# Altium schematic symbol library Capacitor - Aluminium TH.SchLib: 4591 symbols (part 14 of 27)
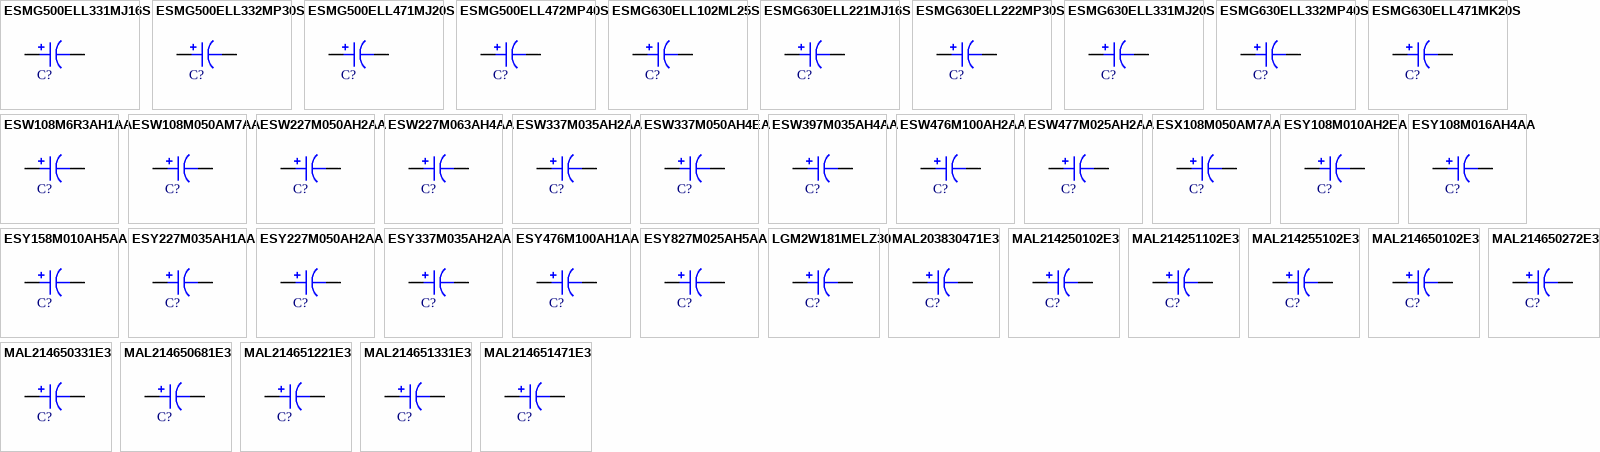
[diagram p127: symbols ESMG500ELL331MJ16S to MAL214651471E3]

## ESMG630ELL221MJ16S
designator C?, comment 220uF  (value not drawn)
CAP ALUM 220UF 20% 63V RADIAL; Part Number: ESMG630ELL221MJ16S; Manufacturer: United Chemi-Con; TemperatureRange: -40C ~ 85C; Type: Polar; Ripple Current: 490mA @ 120Hz; Value: 220uF; PartId: 25335; Supplier 1: Digi-Key; Supplier Part Number 1: 565-1129-ND; ComponentLink1Description: Datasheet; ComponentLink1URL: http://www.chemi-con.com/upload/files/6/3/873997624d9b1bc8060f8.pdf; ComponentLink2Description: Digi-Key Listing; ComponentLink2URL: https://www.digikey.com/product-detail/en/united-chemi-con/ESMG630ELL221MJ16S/565-1129-ND/755645; Tolerance: 20%; Voltage: 63V; Price: 0.67; Device Package: Radial, Can, 10mm
footprint CAP AL TH D10 L5 H17.5
pins: 1, 2

## ESMG630ELL222MP30S
designator C?, comment 2200uF  (value not drawn)
CAP ALUM 2200UF 20% 63V RADIAL; Part Number: ESMG630ELL222MP30S; Manufacturer: United Chemi-Con; TemperatureRange: -40C ~ 85C; Type: Polar; Ripple Current: 2.19A @ 120Hz; Value: 2200uF; PartId: 27563; Supplier 1: Digi-Key; Supplier Part Number 1: 565-1137-ND; ComponentLink1Description: Datasheet; ComponentLink1URL: http://www.chemi-con.com/upload/files/6/3/873997624d9b1bc8060f8.pdf; ComponentLink2Description: Digi-Key Listing; ComponentLink2URL: https://www.digikey.com/product-detail/en/united-chemi-con/ESMG630ELL222MP30S/565-1137-ND/755653; Tolerance: 20%; Voltage: 63V; Price: 4.28; Device Package: Radial, Can, 22mm
footprint CAP AL TH D22 L10 H33
pins: 1, 2

## ESMG630ELL331MJ20S
designator C?, comment 330uF  (value not drawn)
CAP ALUM 330UF 20% 63V RADIAL; Part Number: ESMG630ELL331MJ20S; Manufacturer: United Chemi-Con; TemperatureRange: -40C ~ 85C; Type: Polar; Ripple Current: 710mA @ 120Hz; Value: 330uF; PartId: 25671; Supplier 1: Digi-Key; Supplier Part Number 1: 565-1130-ND; ComponentLink1Description: Datasheet; ComponentLink1URL: http://www.chemi-con.com/upload/files/6/3/873997624d9b1bc8060f8.pdf; ComponentLink2Description: Digi-Key Listing; ComponentLink2URL: https://www.digikey.com/product-detail/en/united-chemi-con/ESMG630ELL331MJ20S/565-1130-ND/755646; Tolerance: 20%; Voltage: 63V; Price: 0.77; Device Package: Radial, Can, 10mm
footprint CAP AL TH D10 L5 H22
pins: 1, 2

## ESMG630ELL332MP40S
designator C?, comment 3300uF  (value not drawn)
CAP ALUM 3300UF 20% 63V RADIAL; Part Number: ESMG630ELL332MP40S; Manufacturer: United Chemi-Con; TemperatureRange: -40C ~ 85C; Type: Polar; Ripple Current: 2.81A @ 120Hz; Value: 3300uF; PartId: 27583; Supplier 1: Digi-Key; Supplier Part Number 1: 565-1138-ND; ComponentLink1Description: Datasheet; ComponentLink1URL: http://www.chemi-con.com/upload/files/6/3/873997624d9b1bc8060f8.pdf; ComponentLink2Description: Digi-Key Listing; ComponentLink2URL: https://www.digikey.com/product-detail/en/united-chemi-con/ESMG630ELL332MP40S/565-1138-ND/755654; Tolerance: 20%; Voltage: 63V; Price: 5.18; Device Package: Radial, Can, 22mm
footprint CAP AL TH D22 L10 H43
pins: 1, 2

## ESMG630ELL471MK20S
designator C?, comment 470uF  (value not drawn)
CAP ALUM 470UF 20% 63V RADIAL; Part Number: ESMG630ELL471MK20S; Manufacturer: United Chemi-Con; TemperatureRange: -40C ~ 85C; Type: Polar; Ripple Current: 900mA @ 120Hz; Value: 470uF; PartId: 23023; Supplier 1: Digi-Key; Supplier Part Number 1: 565-1131-ND; ComponentLink1Description: Datasheet; ComponentLink1URL: http://www.chemi-con.com/upload/files/6/3/873997624d9b1bc8060f8.pdf; ComponentLink2Description: Digi-Key Listing; ComponentLink2URL: https://www.digikey.com/product-detail/en/united-chemi-con/ESMG630ELL471MK20S/565-1131-ND/755647; Tolerance: 20%; Voltage: 63V; Price: 0; Device Package: Radial, Can, 12.5mm
footprint CAP AL TH D12.5 L5 H21.5
pins: 1, 2

## ESW108M6R3AH1AA
designator C?, comment 1000uF  (value not drawn)
CAP ALUM 1000UF 20% 6.3V RADIAL; Part Number: ESW108M6R3AH1AA; Manufacturer: KEMET; TemperatureRange: -40C ~ 105C; Type: Polar; Ripple Current: 453mA @ 120Hz; Impedance: 90 mOhm; Value: 1000uF; PartId: 24830; Supplier 1: Digi-Key; Supplier Part Number 1: 399-6625-ND; ComponentLink1Description: Datasheet; ComponentLink1URL: http://www.kemet.com/docfinder?Partnumber=ESW108M6R3AH1AA; ComponentLink2Description: Digi-Key Listing; ComponentLink2URL: https://www.digikey.com/product-detail/en/kemet/ESW108M6R3AH1AA/399-6625-ND/3083040; Tolerance: 20%; Voltage: 6.3V; Price: 0.46; Device Package: Radial, Can, 10mm
footprint CAP AL TH D10 L5 H14.5
pins: 1, 2

## ESW108M050AM7AA
designator C?, comment 1000uF  (value not drawn)
CAP ALUM 1000UF 20% 50V RADIAL; Part Number: ESW108M050AM7AA; Manufacturer: KEMET; TemperatureRange: -40C ~ 105C; Type: Polar; Ripple Current: 1.341A @ 120Hz; Impedance: 34 mOhm; Value: 1000uF; PartId: 26921; Supplier 1: Digi-Key; Supplier Part Number 1: 399-6623-ND; ComponentLink1Description: Datasheet; ComponentLink1URL: http://www.kemet.com/docfinder?Partnumber=ESW108M050AM7AA; ComponentLink2Description: Digi-Key Listing; ComponentLink2URL: https://www.digikey.com/product-detail/en/kemet/ESW108M050AM7AA/399-6623-ND/3083038; Tolerance: 20%; Voltage: 50V; Price: 1.7; Device Package: Radial, Can, 16mm
footprint CAP AL TH D16 L7.5 H27
pins: 1, 2

## ESW227M050AH2AA
designator C?, comment 220uF  (value not drawn)
CAP ALUM 220UF 20% 50V RADIAL; Part Number: ESW227M050AH2AA; Manufacturer: KEMET; TemperatureRange: -40C ~ 105C; Type: Polar; Ripple Current: 425mA @ 120Hz; Impedance: 119 mOhm; Value: 220uF; PartId: 25265; Supplier 1: Digi-Key; Supplier Part Number 1: 399-6628-ND; ComponentLink1Description: Datasheet; ComponentLink1URL: http://www.kemet.com/docfinder?Partnumber=ESW227M050AH2AA; ComponentLink2Description: Digi-Key Listing; ComponentLink2URL: https://www.digikey.com/product-detail/en/kemet/ESW227M050AH2AA/399-6628-ND/3083043; Tolerance: 20%; Voltage: 50V; Price: 0.6; Device Package: Radial, Can, 10mm
footprint CAP AL TH D10 L5 H17.5
pins: 1, 2

## ESW227M063AH4AA
designator C?, comment 220uF  (value not drawn)
CAP ALUM 220UF 20% 63V RADIAL; Part Number: ESW227M063AH4AA; Manufacturer: KEMET; TemperatureRange: -40C ~ 105C; Type: Polar; Ripple Current: 442.5mA @ 120Hz; Impedance: 147 mOhm; Value: 220uF; PartId: 25641; Supplier 1: Digi-Key; Supplier Part Number 1: 399-6114-ND; ComponentLink1Description: Datasheet; ComponentLink1URL: http://www.kemet.com/docfinder?Partnumber=ESW227M063AH4AA; ComponentLink2Description: Digi-Key Listing; ComponentLink2URL: https://www.digikey.com/product-detail/en/kemet/ESW227M063AH4AA/399-6114-ND/2712543; Tolerance: 20%; Voltage: 63V; Price: 0.73; Device Package: Radial, Can, 10mm
footprint CAP AL TH D10 L5 H22
pins: 1, 2

## ESW337M035AH2AA
designator C?, comment 330uF  (value not drawn)
CAP ALUM 330UF 20% 35V RADIAL; Part Number: ESW337M035AH2AA; Manufacturer: KEMET; TemperatureRange: -40C ~ 105C; Type: Polar; Ripple Current: 577.5mA @ 120Hz; Impedance: 68 mOhm; Value: 330uF; PartId: 25216; Supplier 1: Digi-Key; Supplier Part Number 1: 399-6115-ND; ComponentLink1Description: Datasheet; ComponentLink1URL: http://www.kemet.com/docfinder?Partnumber=ESW337M035AH2AA; ComponentLink2Description: Digi-Key Listing; ComponentLink2URL: https://www.digikey.com/product-detail/en/kemet/ESW337M035AH2AA/399-6115-ND/2712545; Tolerance: 20%; Voltage: 35V; Price: 0.53; Device Package: Radial, Can, 10mm
footprint CAP AL TH D10 L5 H17.5
pins: 1, 2

## ESW337M050AH4EA
designator C?, comment 330uF  (value not drawn)
CAP ALUM 330UF 20% 50V RADIAL; Part Number: ESW337M050AH4EA; Manufacturer: KEMET; TemperatureRange: -40C ~ 105C; Type: Polar; Ripple Current: 566.5mA @ 120Hz; Impedance: 90 mOhm; Value: 330uF; PartId: 25472; Supplier 1: Digi-Key; Supplier Part Number 1: 399-6661-3-ND; ComponentLink1Description: Datasheet; ComponentLink1URL: http://www.kemet.com/docfinder?Partnumber=ESW337M050AH4EA; ComponentLink2Description: Digi-Key Listing; ComponentLink2URL: https://www.digikey.com/product-detail/en/kemet/ESW337M050AH4EA/399-6661-3-ND/3083076; Tolerance: 20%; Voltage: 50V; Price: 0.2933; Device Package: Radial, Can, 10mm
footprint CAP AL TH D10 L5 H22
pins: 1, 2

## ESW397M035AH4AA
designator C?, comment 390uF  (value not drawn)
CAP ALUM 390UF 20% 35V RADIAL; Part Number: ESW397M035AH4AA; Manufacturer: KEMET; TemperatureRange: -40C ~ 105C; Type: Polar; Ripple Current: 671mA @ 120Hz; Impedance: 52 mOhm; Value: 390uF; PartId: 25512; Supplier 1: Digi-Key; Supplier Part Number 1: 399-6630-ND; ComponentLink1Description: Datasheet; ComponentLink1URL: http://www.kemet.com/docfinder?Partnumber=ESW397M035AH4AA; ComponentLink2Description: Digi-Key Listing; ComponentLink2URL: https://www.digikey.com/product-detail/en/kemet/ESW397M035AH4AA/399-6630-ND/3083045; Tolerance: 20%; Voltage: 35V; Price: 0.54; Device Package: Radial, Can, 10mm
footprint CAP AL TH D10 L5 H22
pins: 1, 2

## ESW476M100AH2AA
designator C?, comment 47uF  (value not drawn)
CAP ALUM 47UF 20% 100V RADIAL; Part Number: ESW476M100AH2AA; Manufacturer: KEMET; TemperatureRange: -40C ~ 105C; Type: Polar; Ripple Current: 210mA @ 120Hz; Impedance: 370 mOhm; Value: 47uF; PartId: 25145; Supplier 1: Digi-Key; Supplier Part Number 1: 399-6631-ND; ComponentLink1Description: Datasheet; ComponentLink1URL: http://www.kemet.com/docfinder?Partnumber=ESW476M100AH2AA; ComponentLink2Description: Digi-Key Listing; ComponentLink2URL: https://www.digikey.com/product-detail/en/kemet/ESW476M100AH2AA/399-6631-ND/3083046; Tolerance: 20%; Voltage: 100V; Price: 0.41; Device Package: Radial, Can, 10mm
footprint CAP AL TH D10 L5 H17.5
pins: 1, 2

## ESW477M025AH2AA
designator C?, comment 470uF  (value not drawn)
CAP ALUM 470UF 20% 25V RADIAL; Part Number: ESW477M025AH2AA; Manufacturer: KEMET; TemperatureRange: -40C ~ 105C; Type: Polar; Ripple Current: 577.5mA @ 120Hz; Impedance: 68 mOhm; Value: 470uF; PartId: 25280; Supplier 1: Digi-Key; Supplier Part Number 1: 399-6116-ND; ComponentLink1Description: Datasheet; ComponentLink1URL: http://www.kemet.com/docfinder?Partnumber=ESW477M025AH2AA; ComponentLink2Description: Digi-Key Listing; ComponentLink2URL: https://www.digikey.com/product-detail/en/kemet/ESW477M025AH2AA/399-6116-ND/2712546; Tolerance: 20%; Voltage: 25V; Price: 0.62; Device Package: Radial, Can, 10mm
footprint CAP AL TH D10 L5 H17.5
pins: 1, 2

## ESX108M050AM7AA
designator C?, comment 1000uF  (value not drawn)
CAP ALUM 1000UF 20% 50V RADIAL; Part Number: ESX108M050AM7AA; Manufacturer: KEMET; TemperatureRange: -40C ~ 105C; Type: Polar; Ripple Current: 1.44A @ 120Hz; Impedance: 60 mOhm; Value: 1000uF; PartId: 26859; Supplier 1: Digi-Key; Supplier Part Number 1: 399-6635-ND; ComponentLink1Description: Datasheet; ComponentLink1URL: //media.digikey.com/pdf/Data%20Sheets/Kemet%20PDFs/Aluminum_Capacitors.pdf; ComponentLink2Description: Digi-Key Listing; ComponentLink2URL: https://www.digikey.com/product-detail/en/kemet/ESX108M050AM7AA/399-6635-ND/3083050; Tolerance: 20%; Voltage: 50V; Price: 1.22; Device Package: Radial, Can, 16mm
footprint CAP AL TH D16 L7.5 H27
pins: 1, 2

## ESY108M010AH2EA
designator C?, comment 1000uF  (value not drawn)
CAP ALUM 1000UF 20% 10V RADIAL; Part Number: ESY108M010AH2EA; Manufacturer: KEMET; TemperatureRange: -40C ~ 105C; Type: Polar; Ripple Current: 1.072A @ 120Hz; Impedance: 38 mOhm; Value: 1000uF; PartId: 25017; Supplier 1: Digi-Key; Supplier Part Number 1: 399-6662-3-ND; ComponentLink1Description: Datasheet; ComponentLink1URL: http://www.kemet.com/docfinder?Partnumber=ESY108M010AH2EA; ComponentLink2Description: Digi-Key Listing; ComponentLink2URL: https://www.digikey.com/product-detail/en/kemet/ESY108M010AH2EA/399-6662-3-ND/3083077; Tolerance: 20%; Voltage: 10V; Price: 0.16; Device Package: Radial, Can, 10mm
footprint CAP AL TH D10 L5 H17.5
pins: 1, 2

## ESY108M016AH4AA
designator C?, comment 1000uF  (value not drawn)
CAP ALUM 1000UF 20% 16V RADIAL; Part Number: ESY108M016AH4AA; Manufacturer: KEMET; TemperatureRange: -40C ~ 105C; Type: Polar; Ripple Current: 1.365A @ 120Hz; Impedance: 26 mOhm; Value: 1000uF; PartId: 25630; Supplier 1: Digi-Key; Supplier Part Number 1: 399-6637-ND; ComponentLink1Description: Datasheet; ComponentLink1URL: http://www.kemet.com/docfinder?Partnumber=ESY108M016AH4AA; ComponentLink2Description: Digi-Key Listing; ComponentLink2URL: https://www.digikey.com/product-detail/en/kemet/ESY108M016AH4AA/399-6637-ND/3083052; Tolerance: 20%; Voltage: 16V; Price: 0.72; Device Package: Radial, Can, 10mm
footprint CAP AL TH D10 L5 H22
pins: 1, 2

## ESY158M010AH5AA
designator C?, comment 1500uF  (value not drawn)
CAP ALUM 1500UF 20% 10V RADIAL; Part Number: ESY158M010AH5AA; Manufacturer: KEMET; TemperatureRange: -40C ~ 105C; Type: Polar; Ripple Current: 1.72A @ 120Hz; Impedance: 23 mOhm; Value: 1500uF; PartId: 26086; Supplier 1: Digi-Key; Supplier Part Number 1: 399-6638-ND; ComponentLink1Description: Datasheet; ComponentLink1URL: http://www.kemet.com/docfinder?Partnumber=ESY158M010AH5AA; ComponentLink2Description: Digi-Key Listing; ComponentLink2URL: https://www.digikey.com/product-detail/en/kemet/ESY158M010AH5AA/399-6638-ND/3083053; Tolerance: 20%; Voltage: 10V; Price: 0.73; Device Package: Radial, Can, 10mm
footprint CAP AL TH D10 L5 H30
pins: 1, 2

## ESY227M035AH1AA
designator C?, comment 220uF  (value not drawn)
CAP ALUM 220UF 20% 35V RADIAL; Part Number: ESY227M035AH1AA; Manufacturer: KEMET; TemperatureRange: -40C ~ 105C; Type: Polar; Ripple Current: 721mA @ 120Hz; Impedance: 53 mOhm; Value: 220uF; PartId: 24837; Supplier 1: Digi-Key; Supplier Part Number 1: 399-6122-ND; ComponentLink1Description: Datasheet; ComponentLink1URL: http://capacitoredge.kemet.com/capedge2/DataSheet?pn=ESY227M035AH1AA; ComponentLink2Description: Digi-Key Listing; ComponentLink2URL: https://www.digikey.com/product-detail/en/kemet/ESY227M035AH1AA/399-6122-ND/2712528; Tolerance: 20%; Voltage: 35V; Price: 0.46; Device Package: Radial, Can, 10mm
footprint CAP AL TH D10 L5 H14.5
pins: 1, 2

## ESY227M050AH2AA
designator C?, comment 220uF  (value not drawn)
CAP ALUM 220UF 20% 50V RADIAL; Part Number: ESY227M050AH2AA; Manufacturer: KEMET; TemperatureRange: -40C ~ 105C; Type: Polar; Ripple Current: 959mA @ 120Hz; Impedance: 42 mOhm; Value: 220uF; PartId: 25206; Supplier 1: Digi-Key; Supplier Part Number 1: 399-6123-ND; ComponentLink1Description: Datasheet; ComponentLink1URL: http://capacitoredge.kemet.com/capedge2/DataSheet?pn=ESY227M050AH2AA; ComponentLink2Description: Digi-Key Listing; ComponentLink2URL: https://www.digikey.com/product-detail/en/kemet/ESY227M050AH2AA/399-6123-ND/2712529; Tolerance: 20%; Voltage: 50V; Price: 0.51; Device Package: Radial, Can, 10mm
footprint CAP AL TH D10 L5 H17.5
pins: 1, 2

## ESY337M035AH2AA
designator C?, comment 330uF  (value not drawn)
CAP ALUM 330UF 20% 35V RADIAL; Part Number: ESY337M035AH2AA; Manufacturer: KEMET; TemperatureRange: -40C ~ 105C; Type: Polar; Ripple Current: 1.001A @ 120Hz; Impedance: 38 mOhm; Value: 330uF; PartId: 25376; Supplier 1: Digi-Key; Supplier Part Number 1: 399-6126-ND; ComponentLink1Description: Datasheet; ComponentLink1URL: http://capacitoredge.kemet.com/capedge2/DataSheet?pn=ESY337M035AH2AA; ComponentLink2Description: Digi-Key Listing; ComponentLink2URL: https://www.digikey.com/product-detail/en/kemet/ESY337M035AH2AA/399-6126-ND/2712531; Tolerance: 20%; Voltage: 35V; Price: 0.73; Device Package: Radial, Can, 10mm
footprint CAP AL TH D10 L5 H17.5
pins: 1, 2

## ESY476M100AH1AA
designator C?, comment 47uF  (value not drawn)
CAP ALUM 47UF 20% 100V RADIAL; Part Number: ESY476M100AH1AA; Manufacturer: KEMET; TemperatureRange: -40C ~ 105C; Type: Polar; Ripple Current: 315mA @ 120Hz; Impedance: 240 mOhm; Value: 47uF; PartId: 24728; Supplier 1: Digi-Key; Supplier Part Number 1: 399-6643-ND; ComponentLink1Description: Datasheet; ComponentLink1URL: http://www.kemet.com/docfinder?Partnumber=ESY476M100AH1AA; ComponentLink2Description: Digi-Key Listing; ComponentLink2URL: https://www.digikey.com/product-detail/en/kemet/ESY476M100AH1AA/399-6643-ND/3083058; Tolerance: 20%; Voltage: 100V; Price: 0.41; Device Package: Radial, Can, 10mm
footprint CAP AL TH D10 L5 H14.5
pins: 1, 2

## ESY827M025AH5AA
designator C?, comment 820uF  (value not drawn)
CAP ALUM 820UF 20% 25V RADIAL; Part Number: ESY827M025AH5AA; Manufacturer: KEMET; TemperatureRange: -40C ~ 105C; Type: Polar; Ripple Current: 1.612A @ 120Hz; Impedance: 23 mOhm; Value: 820uF; PartId: 26169; Supplier 1: Digi-Key; Supplier Part Number 1: 399-6647-ND; ComponentLink1Description: Datasheet; ComponentLink1URL: http://www.kemet.com/docfinder?Partnumber=ESY827M025AH5AA; ComponentLink2Description: Digi-Key Listing; ComponentLink2URL: https://www.digikey.com/product-detail/en/kemet/ESY827M025AH5AA/399-6647-ND/3083062; Tolerance: 20%; Voltage: 25V; Price: 0.94; Device Package: Radial, Can, 10mm
footprint CAP AL TH D10 L5 H30
pins: 1, 2

## LGM2W181MELZ30
designator C?, comment 180uF  (value not drawn)
CAP ALUM 180UF 20% 450V SNAP; Part Number: LGM2W181MELZ30; Manufacturer: Nichicon; TemperatureRange: -25C ~ 105C; Type: Polar; Ripple Current: 470mA @ 120Hz; Value: 180uF; PartId: 27566; Supplier 1: Digi-Key; Supplier Part Number 1: 493-14670-ND; ComponentLink1Description: Datasheet; ComponentLink1URL: //media.digikey.com/pdf/Data%20Sheets/Nichicon%20PDFs/LGM_Series_450V.pdf; ComponentLink2Description: Digi-Key Listing; ComponentLink2URL: https://www.digikey.com/product-detail/en/nichicon/LGM2W181MELZ30/493-14670-ND/6049374; Tolerance: 20%; Voltage: 450V; Price: 5.25; Device Package: Radial, Can, 22mm
footprint CAP AL TH D22 L10 H33
pins: 1, 2

## MAL203830471E3
designator C?, comment 470uF  (value not drawn)
CAP ALUM 470UF 20% 35V RADIAL; Part Number: MAL203830471E3; Manufacturer: Vishay BC Components; TemperatureRange: -40C ~ 85C; Ripple Current: 740mA; Value: 470uF; PartId: 25456; Supplier 1: Digi-Key; Supplier Part Number 1: MAL203830471E3-ND; ComponentLink1Description: Datasheet; ComponentLink1URL: http://www.vishay.com/docs/28309/038rsu.pdf; ComponentLink2Description: Digi-Key Listing; ComponentLink2URL: https://www.digikey.com/product-detail/en/vishay-bc-components/MAL203830471E3/MAL203830471E3-ND/3675028; Tolerance: 20%; Voltage: 35V; Price: 0.222; Device Package: Radial, Can, 10mm
footprint CAP AL TH D10 L5 H22
pins: 1, 2

## MAL214250102E3
designator C?, comment 1000uF  (value not drawn)
CAP ALUM 1000UF 20% 35V RADIAL; Part Number: MAL214250102E3; Manufacturer: Vishay BC Components; TemperatureRange: -40C ~ 105C; Ripple Current: 810mA; Value: 1000uF; PartId: 23340; Supplier 1: Digi-Key; Supplier Part Number 1: 4602PHBK-ND; ComponentLink1Description: Datasheet; ComponentLink1URL: http://www.vishay.com/docs/28402/142rhs.pdf; ComponentLink2Description: Digi-Key Listing; ComponentLink2URL: https://www.digikey.com/product-detail/en/vishay-bc-components/MAL214250102E3/4602PHBK-ND/2690941; Tolerance: 20%; Voltage: 35V; Price: 0.84; Device Package: Radial, Can, 12.5mm
footprint CAP AL TH D12.5 L5 H22
pins: 1, 2

## MAL214251102E3
designator C?, comment 1000uF  (value not drawn)
CAP ALUM 1000UF 20% 50V RADIAL; Part Number: MAL214251102E3; Manufacturer: Vishay BC Components; TemperatureRange: -40C ~ 105C; Ripple Current: 950mA; Value: 1000uF; PartId: 24023; Supplier 1: Digi-Key; Supplier Part Number 1: 4603PHBK-ND; ComponentLink1Description: Datasheet; ComponentLink1URL: http://www.vishay.com/docs/28402/142rhs.pdf; ComponentLink2Description: Digi-Key Listing; ComponentLink2URL: https://www.digikey.com/product-detail/en/vishay-bc-components/MAL214251102E3/4603PHBK-ND/2690959; Tolerance: 20%; Voltage: 50V; Price: 1.08; Device Package: Radial, Can, 12.5mm
footprint CAP AL TH D12.5 L5 H27
pins: 1, 2

## MAL214255102E3
designator C?, comment 1000uF  (value not drawn)
CAP ALUM 1000UF 20% 16V RADIAL; Part Number: MAL214255102E3; Manufacturer: Vishay BC Components; TemperatureRange: -40C ~ 105C; Ripple Current: 560mA; Value: 1000uF; PartId: 25224; Supplier 1: Digi-Key; Supplier Part Number 1: 4607PHBK-ND; ComponentLink1Description: Datasheet; ComponentLink1URL: http://www.vishay.com/docs/28402/142rhs.pdf; ComponentLink2Description: Digi-Key Listing; ComponentLink2URL: https://www.digikey.com/product-detail/en/vishay-bc-components/MAL214255102E3/4607PHBK-ND/2690997; Tolerance: 20%; Voltage: 16V; Price: 0.54; Device Package: Radial, Can, 10mm
footprint CAP AL TH D10 L5 H17.5
pins: 1, 2

## MAL214650102E3
designator C?, comment 1000uF  (value not drawn)
CAP ALUM 1000UF 20% 35V RADIAL; Part Number: MAL214650102E3; Manufacturer: Vishay BC Components; TemperatureRange: -55C ~ 125C; Type: Polar; Ripple Current: 2A; Impedance: 33 mOhm; Value: 1000uF; PartId: 24194; Supplier 1: Digi-Key; Supplier Part Number 1: 4489PHBK-ND; ComponentLink1Description: Datasheet; ComponentLink1URL: http://www.vishay.com/docs/28401/146rti.pdf; ComponentLink2Description: Digi-Key Listing; ComponentLink2URL: https://www.digikey.com/product-detail/en/vishay-bc-components/MAL214650102E3/4489PHBK-ND/2410354; Tolerance: 20%; Voltage: 35V; Price: 2.41; Device Package: Radial, Can, 12.5mm
footprint CAP AL TH D12.5 L5 H27
pins: 1, 2

## MAL214650272E3
designator C?, comment 2700uF  (value not drawn)
CAP ALUM 2700UF 20% 35V RADIAL; Part Number: MAL214650272E3; Manufacturer: Vishay BC Components; TemperatureRange: -55C ~ 125C; Type: Polar; Ripple Current: 3.2A; Impedance: 18 mOhm; Value: 2700uF; PartId: 27447; Supplier 1: Digi-Key; Supplier Part Number 1: 4495PHBK-ND; ComponentLink1Description: Datasheet; ComponentLink1URL: http://www.vishay.com/docs/28401/146rti.pdf; ComponentLink2Description: Digi-Key Listing; ComponentLink2URL: https://www.digikey.com/product-detail/en/vishay-bc-components/MAL214650272E3/4495PHBK-ND/2410360; Tolerance: 20%; Voltage: 35V; Price: 4.03; Device Package: Radial, Can, 16mm
footprint CAP AL TH D16 L7.5 H37
pins: 1, 2

## MAL214650331E3
designator C?, comment 330uF  (value not drawn)
CAP ALUM 330UF 20% 35V RADIAL; Part Number: MAL214650331E3; Manufacturer: Vishay BC Components; TemperatureRange: -55C ~ 125C; Type: Polar; Ripple Current: 1.1A; Impedance: 75 mOhm; Value: 330uF; PartId: 25437; Supplier 1: Digi-Key; Supplier Part Number 1: 4486PHBK-ND; ComponentLink1Description: Datasheet; ComponentLink1URL: http://www.vishay.com/docs/28401/146rti.pdf; ComponentLink2Description: Digi-Key Listing; ComponentLink2URL: https://www.digikey.com/product-detail/en/vishay-bc-components/MAL214650331E3/4486PHBK-ND/2410351; Tolerance: 20%; Voltage: 35V; Price: 1.31; Device Package: Radial, Can, 10mm
footprint CAP AL TH D10 L5 H17.5
pins: 1, 2

## MAL214650681E3
designator C?, comment 680uF  (value not drawn)
CAP ALUM 680UF 20% 35V RADIAL; Part Number: MAL214650681E3; Manufacturer: Vishay BC Components; TemperatureRange: -55C ~ 125C; Type: Polar; Ripple Current: 1.6A; Impedance: 43 mOhm; Value: 680uF; PartId: 23534; Supplier 1: Digi-Key; Supplier Part Number 1: 4488PHBK-ND; ComponentLink1Description: Datasheet; ComponentLink1URL: http://www.vishay.com/docs/28401/146rti.pdf; ComponentLink2Description: Digi-Key Listing; ComponentLink2URL: https://www.digikey.com/product-detail/en/vishay-bc-components/MAL214650681E3/4488PHBK-ND/2410353; Tolerance: 20%; Voltage: 35V; Price: 1.98; Device Package: Radial, Can, 12.5mm
footprint CAP AL TH D12.5 L5 H22
pins: 1, 2

## MAL214651221E3
designator C?, comment 220uF  (value not drawn)
CAP ALUM 220UF 20% 50V RADIAL; Part Number: MAL214651221E3; Manufacturer: Vishay BC Components; TemperatureRange: -55C ~ 125C; Type: Polar; Ripple Current: 900mA; Impedance: 120 mOhm; Value: 220uF; PartId: 25435; Supplier 1: Digi-Key; Supplier Part Number 1: 4499PHBK-ND; ComponentLink1Description: Datasheet; ComponentLink1URL: http://www.vishay.com/docs/28401/146rti.pdf; ComponentLink2Description: Digi-Key Listing; ComponentLink2URL: https://www.digikey.com/product-detail/en/vishay-bc-components/MAL214651221E3/4499PHBK-ND/2410364; Tolerance: 20%; Voltage: 50V; Price: 1.31; Device Package: Radial, Can, 10mm
footprint CAP AL TH D10 L5 H17.5
pins: 1, 2

## MAL214651331E3
designator C?, comment 330uF  (value not drawn)
CAP ALUM 330UF 20% 50V RADIAL; Part Number: MAL214651331E3; Manufacturer: Vishay BC Components; TemperatureRange: -55C ~ 125C; Type: Polar; Ripple Current: 1A; Impedance: 90 mOhm; Value: 330uF; PartId: 25997; Supplier 1: Digi-Key; Supplier Part Number 1: 4500PHBK-ND; ComponentLink1Description: Datasheet; ComponentLink1URL: http://www.vishay.com/docs/28401/146rti.pdf; ComponentLink2Description: Digi-Key Listing; ComponentLink2URL: https://www.digikey.com/product-detail/en/vishay-bc-components/MAL214651331E3/4500PHBK-ND/2410365; Tolerance: 20%; Voltage: 50V; Price: 1.52; Device Package: Radial, Can, 10mm
footprint CAP AL TH D10 L5 H22
pins: 1, 2

## MAL214651471E3
designator C?, comment 470uF  (value not drawn)
CAP ALUM 470UF 20% 50V RADIAL; Part Number: MAL214651471E3; Manufacturer: Vishay BC Components; TemperatureRange: -55C ~ 125C; Type: Polar; Ripple Current: 1.25A; Impedance: 65 mOhm; Value: 470uF; PartId: 23533; Supplier 1: Digi-Key; Supplier Part Number 1: 4501PHBK-ND; ComponentLink1Description: Datasheet; ComponentLink1URL: http://www.vishay.com/docs/28401/146rti.pdf; ComponentLink2Description: Digi-Key Listing; ComponentLink2URL: https://www.digikey.com/product-detail/en/vishay-bc-components/MAL214651471E3/4501PHBK-ND/2410366; Tolerance: 20%; Voltage: 50V; Price: 1.98; Device Package: Radial, Can, 12.5mm
footprint CAP AL TH D12.5 L5 H22
pins: 1, 2

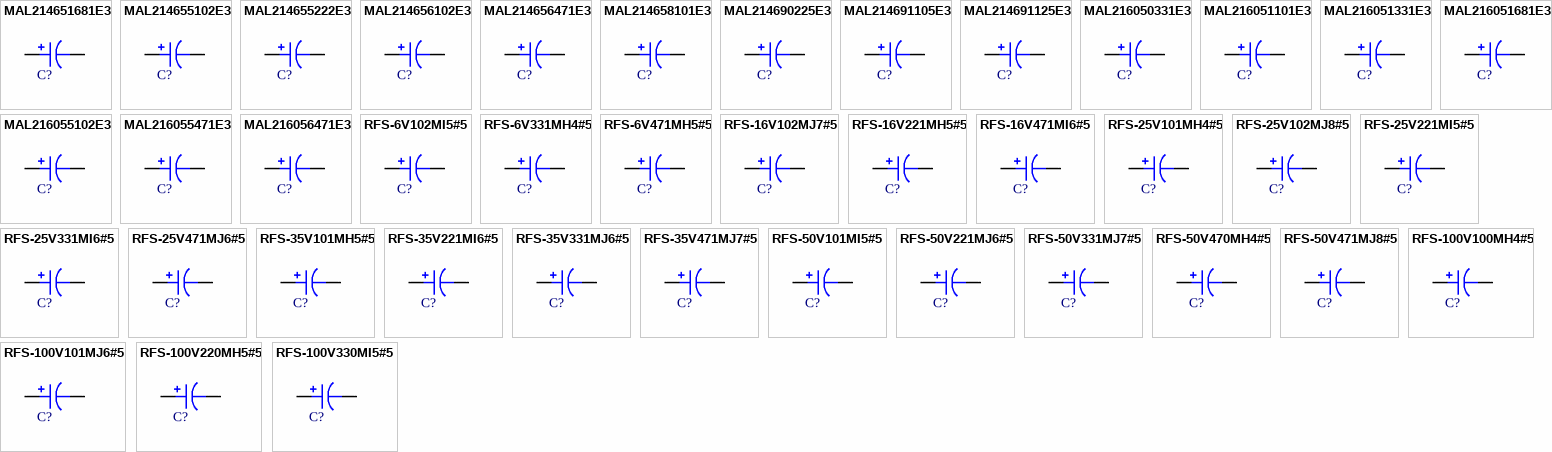
[diagram p56: symbols MAL214651681E3 to RFS-100V330MI5#5]

## MAL214651681E3
designator C?, comment 680uF  (value not drawn)
CAP ALUM 680UF 20% 50V RADIAL; Part Number: MAL214651681E3; Manufacturer: Vishay BC Components; TemperatureRange: -55C ~ 125C; Type: Polar; Ripple Current: 1.7A; Impedance: 50 mOhm; Value: 680uF; PartId: 24193; Supplier 1: Digi-Key; Supplier Part Number 1: 4502PHBK-ND; ComponentLink1Description: Datasheet; ComponentLink1URL: http://www.vishay.com/docs/28401/146rti.pdf; ComponentLink2Description: Digi-Key Listing; ComponentLink2URL: https://www.digikey.com/product-detail/en/vishay-bc-components/MAL214651681E3/4502PHBK-ND/2410367; Tolerance: 20%; Voltage: 50V; Price: 2.41; Device Package: Radial, Can, 12.5mm
footprint CAP AL TH D12.5 L5 H27
pins: 1, 2

## MAL214655102E3
designator C?, comment 1000uF  (value not drawn)
CAP ALUM 1000UF 20% 16V RADIAL; Part Number: MAL214655102E3; Manufacturer: Vishay BC Components; TemperatureRange: -55C ~ 125C; Type: Polar; Ripple Current: 1.25A; Impedance: 60 mOhm; Value: 1000uF; PartId: 25999; Supplier 1: Digi-Key; Supplier Part Number 1: 4462PHBK-ND; ComponentLink1Description: Datasheet; ComponentLink1URL: http://www.vishay.com/docs/28401/146rti.pdf; ComponentLink2Description: Digi-Key Listing; ComponentLink2URL: https://www.digikey.com/product-detail/en/vishay-bc-components/MAL214655102E3/4462PHBK-ND/2410327; Tolerance: 20%; Voltage: 16V; Price: 1.52; Device Package: Radial, Can, 10mm
footprint CAP AL TH D10 L5 H22
pins: 1, 2

## MAL214655222E3
designator C?, comment 2200uF  (value not drawn)
CAP ALUM 2200UF 20% 16V RADIAL; Part Number: MAL214655222E3; Manufacturer: Vishay BC Components; TemperatureRange: -55C ~ 125C; Type: Polar; Ripple Current: 2A; Impedance: 33 mOhm; Value: 2200uF; PartId: 24192; Supplier 1: Digi-Key; Supplier Part Number 1: 4464PHBK-ND; ComponentLink1Description: Datasheet; ComponentLink1URL: http://www.vishay.com/docs/28401/146rti.pdf; ComponentLink2Description: Digi-Key Listing; ComponentLink2URL: https://www.digikey.com/product-detail/en/vishay-bc-components/MAL214655222E3/4464PHBK-ND/2410329; Tolerance: 20%; Voltage: 16V; Price: 2.41; Device Package: Radial, Can, 12.5mm
footprint CAP AL TH D12.5 L5 H27
pins: 1, 2

## MAL214656102E3
designator C?, comment 1000uF  (value not drawn)
CAP ALUM 1000UF 20% 25V RADIAL; Part Number: MAL214656102E3; Manufacturer: Vishay BC Components; TemperatureRange: -55C ~ 125C; Type: Polar; Ripple Current: 1.6A; Impedance: 43 mOhm; Value: 1000uF; PartId: 23532; Supplier 1: Digi-Key; Supplier Part Number 1: 4475PHBK-ND; ComponentLink1Description: Datasheet; ComponentLink1URL: http://www.vishay.com/docs/28401/146rti.pdf; ComponentLink2Description: Digi-Key Listing; ComponentLink2URL: https://www.digikey.com/product-detail/en/vishay-bc-components/MAL214656102E3/4475PHBK-ND/2410340; Tolerance: 20%; Voltage: 25V; Price: 1.98; Device Package: Radial, Can, 12.5mm
footprint CAP AL TH D12.5 L5 H22
pins: 1, 2

## MAL214656471E3
designator C?, comment 470uF  (value not drawn)
CAP ALUM 470UF 20% 25V RADIAL; Part Number: MAL214656471E3; Manufacturer: Vishay BC Components; TemperatureRange: -55C ~ 125C; Type: Polar; Ripple Current: 1.1A; Impedance: 75 mOhm; Value: 470uF; PartId: 25436; Supplier 1: Digi-Key; Supplier Part Number 1: 4473PHBK-ND; ComponentLink1Description: Datasheet; ComponentLink1URL: http://www.vishay.com/docs/28401/146rti.pdf; ComponentLink2Description: Digi-Key Listing; ComponentLink2URL: https://www.digikey.com/product-detail/en/vishay-bc-components/MAL214656471E3/4473PHBK-ND/2410338; Tolerance: 20%; Voltage: 25V; Price: 1.31; Device Package: Radial, Can, 10mm
footprint CAP AL TH D10 L5 H17.5
pins: 1, 2

## MAL214658101E3
designator C?, comment 100uF  (value not drawn)